# Altium footprint library 5.12-直插元件.PcbLib: 165 footprints (part 2 of 11)
Each footprint in its own frame and in the unit in brackets; x right, y up, seen from the top. Pads: shape width x height; smd on the part's side, far side on the other; paste and mask are expansions set on the pad; w line width, h text height; cw(c..) or ccw(c..) is an arc to the next point about the centre after c.
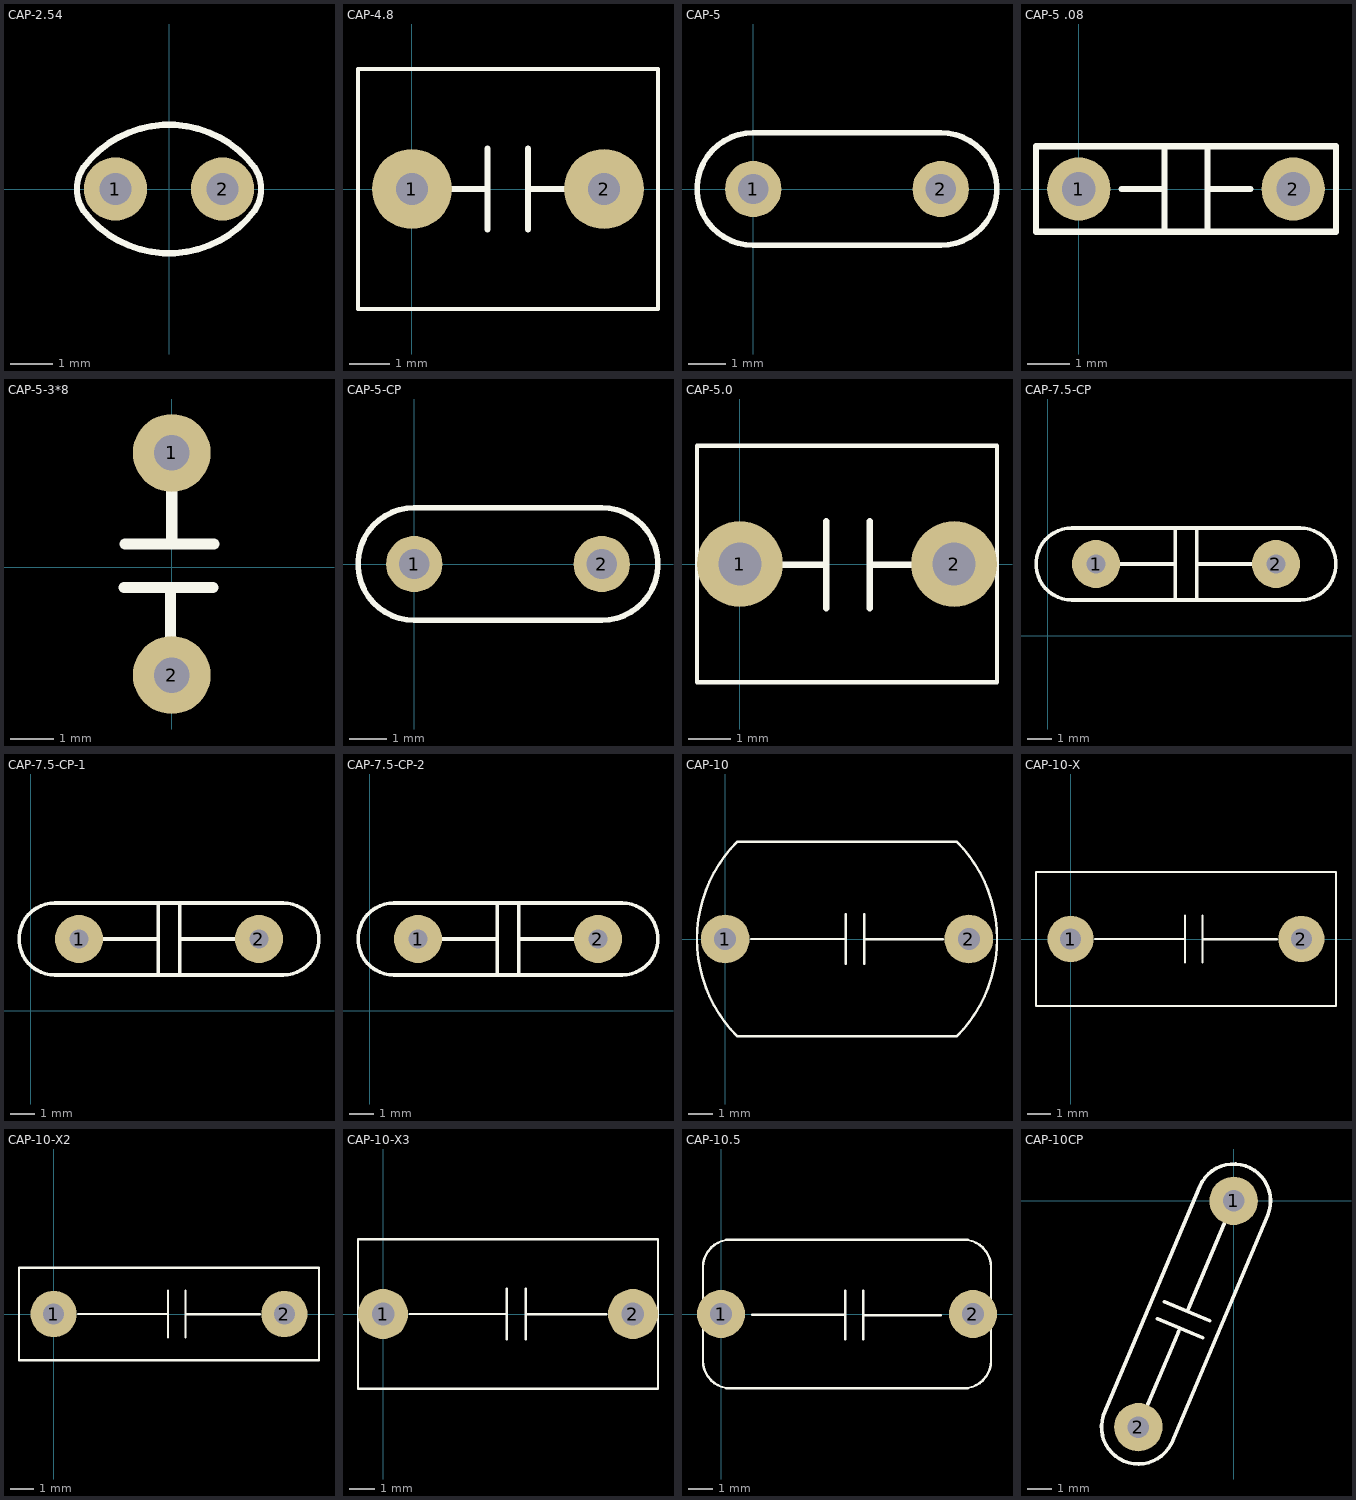
[diagram p1: the footprints below, top view; thin cyan lines are the x and y axes]

## CAP-2.54 [mm] "[ PCBѧϰȺ514746572 ]"
pads (2):
  round 1.5 hole 0.762: 1(-1.27,0) 2(1.27,0)
Top Overlay:
  lines w0.15: -2.032,-0.508 ccw(c0,1.016) 2.032,-0.508 ; -2.032,0.508 cw(c0,-1.016) 2.032,0.508 ; -2.031,-0.507 cw(c-1.27,0) -2.031,0.507 ; 2.031,-0.507 ccw(c1.27,0) 2.031,0.507
3D body "Cap_100n.step": height 5.92, standoff -2, extent -2.919,-0.848 2.919,0.848

## CAP-4.8 [mm] "[ PCBѧϰȺ514746572 ]"
pads (2):
  round 2 hole 0.8: 1(0,0) 2(4.8,0)
Top Overlay:
  lines w0.1: -1.35,-3 6.15,-3 6.15,3 -1.35,3 -1.35,-3
  lines w0.15: 0.869,0 1.885,0 ; 1.885,-1.016 1.885,1.016 ; 2.901,-1.016 2.901,1.016 ; 2.901,0 3.917,0
3D body "User Library-folienkondi - wima mks 2.step": height 11.5, standoff -3, extent -1.2,-2.7 6,2.7

## CAP-5 [mm] "[ PCBѧϰȺ514746572 ]"
pads (2):
  round 1.5 hole 0.8: 1(0,0) 2(5,0)
Top Overlay:
  lines w0.15: 0,-1.5 cw(c0,0) 0,1.5 5,1.5 cw(c5,0) 5,-1.5 0,-1.5
3D body "User Library-100n.step": height 7.6, standoff -4.6, extent -1.25,-1.25 6.25,1.25

## CAP-5 .08 [mm] "[ PCBѧϰȺ514746572 ]"
pads (2):
  round 1.5 hole 0.8: 1(0,0) 2(5.08,0)
Top Overlay:
  lines w0.15: 1.016,0 2.032,0 ; 2.032,-1.016 2.032,1.016 ; 3.048,-1.016 3.048,1.016 ; 3.048,0 4.064,0 ; -1.016,-1.016 6.096,-1.016 6.096,1.016 -1.016,1.016 -1.016,-1.016
3D body "SW3dPS-CAPNP5.STEP": height 6.51, standoff -1.26, extent -1.27,-1.27 6.35,1.27

## CAP-5-3*8 [mil] "[ PCBѧϰȺ514746572 ]"
pads (2):
  round 70 hole 32: 1(0,103) 2(0,-97)
Top Overlay:
  lines w10: -43,-18 37,-18 ; -42,21 38,21 ; -1,-96 -1,-18 ; 0,21 0,103
3D body "User Library-Capacitor no pol 0_2in pitch.STEP": height 285, standoff -93.74, extent -60,-104 65,116

## CAP-5-CP [mm] "[ PCBѧϰȺ514746572 ]"
pads (2):
  round 1.5 hole 0.8: 1(0,0) 2(5,0)
Top Overlay:
  lines w0.15: 0,-1.5 cw(c0,0) 0,1.5 5,1.5 cw(c5,0) 5,-1.5 0,-1.5
3D body "User Library-Kondensator_5mm.step": height 10.5, standoff -2.07, extent -1.5,-1.255 6.5,1.255

## CAP-5.0 [mm] "[ PCBѧϰȺ514746572 ]"
pads (2):
  round 2 hole 1: 1(0,0) 2(5,0)
Top Overlay:
  lines w0.1: 6,-2.76 -1,-2.76 -1,2.76 6,2.76 ; 6,-2.75 6,2.75
  lines w0.15: 1,-0.021 2.016,-0.021 ; 2.016,-1.037 2.016,0.995 ; 3.032,-1.037 3.032,0.995 ; 3.032,-0.021 4.048,-0.021
3D body "User Library-CAPACITOR_5mm.step": height 11, standoff -4, extent -1,-2.76 6,2.76

## CAP-7.5-CP [mm] "[ PCBѧϰȺ514746572 ]"
pads (2):
  round 2 hole 0.8: 1(2,3) 2(9.5,3)
Top Overlay:
  lines w0.15: 2,3 5.3,3 ; 5.3,1.5 5.3,4.5 ; 6.2,1.5 6.2,4.5 ; 6.2,3 9.5,3 ; 1,1.5 cw(c1,3) 1,4.5 10.5,4.5 cw(c10.5,3) 10.5,1.5 1,1.5
3D body "User Library-final MOV7,5.step": height 16.5, standoff -2, extent 0.049,1.587 11.451,4.413

## CAP-7.5-CP-1 [mm] "[ PCBѧϰȺ514746572 ]"
pads (2):
  round 2 hole 0.8: 1(2,3) 2(9.5,3)
Top Overlay:
  lines w0.15: 2,3 5.3,3 ; 5.3,1.5 5.3,4.5 ; 6.2,1.5 6.2,4.5 ; 6.2,3 9.5,3 ; 1,1.5 cw(c1,3) 1,4.5 10.5,4.5 cw(c10.5,3) 10.5,1.5 1,1.5
3D body "ECK-A3D102KBP.step": height 9.03, standoff -4.16, extent 1.749,1.804 9.75,4.196

## CAP-7.5-CP-2 [mm] "[ PCBѧϰȺ514746572 ]"
pads (2):
  round 2 hole 0.8: 1(2,3) 2(9.5,3)
Top Overlay:
  lines w0.15: 2,3 5.3,3 ; 5.3,1.5 5.3,4.5 ; 6.2,1.5 6.2,4.5 ; 6.2,3 9.5,3 ; 1,1.5 cw(c1,3) 1,4.5 10.5,4.5 cw(c10.5,3) 10.5,1.5 1,1.5
3D body "User Library-DEBB33A472KA3B.STEP": height 16, standoff -4, extent -0.25,1.01 11.75,4.99

## CAP-10 [mm] "[ PCBѧϰȺ514746572 ]"
pads (2):
  round 2 hole 0.9: 1(0,0) 2(10,0)
Top Overlay:
  lines w0.1: 1.072,0 4.953,0.003 ; 4.953,-1.016 4.953,1.016 ; 5.715,-1.016 5.715,1.016 ; 5.715,-0.007 8.939,-0.007 ; 0.5,-4 cw(c4.5,0) 0.5,4 9.5,4 cw(c5.5,0) 9.5,-4 0.5,-4
3D body "User Library-RAD CAP 12_5MM.STEP": height 15.97, standoff -4.44, extent -1.25,-2.95 11.25,2.95

## CAP-10-X [mm] "[ PCBѧϰȺ514746572 ]"
pads (2):
  round 2 hole 0.9: 1(0,0) 2(10,0)
Top Overlay:
  lines w0.1: 1.072,0 4.953,0.003 ; 4.953,-1.016 4.953,1.016 ; 5.715,-1.016 5.715,1.016 ; 5.715,-0.007 8.939,-0.007 ; -1.5,-2.9 11.5,-2.9 11.5,2.9 -1.5,2.9 -1.5,-2.9
3D body "User Library-B81122-C1472-M.step": height 12, standoff -1.5, extent -1.5,-3 11.5,3

## CAP-10-X2 [mm] "[ PCBѧϰȺ514746572 ]"
pads (2):
  round 2 hole 0.9: 1(0,0) 2(10,0)
Top Overlay:
  lines w0.1: 1.072,0 4.953,0.003 ; 4.953,-1.016 4.953,1.016 ; 5.715,-1.016 5.715,1.016 ; 5.715,-0.007 8.939,-0.007 ; -1.5,-2 11.5,-2 11.5,2 -1.5,2 -1.5,-2
3D body "User Library-MKS4(H9).step": height 9, standoff -1.5, extent -1.5,-2 11.5,2

## CAP-10-X3 [mm] "[ PCBѧϰȺ514746572 ]"
pads (2):
  round 2 hole 0.9: 1(0,0) 2(10,0)
Top Overlay:
  lines w0.1: 1.072,0 4.953,0.003 ; 4.953,-1.016 4.953,1.016 ; 5.715,-1.016 5.715,1.016 ; 5.715,-0.007 8.939,-0.007 ; -1,-3 -1,3 11,3 11,-3 -1,-3
3D body "User Library-K73-17(12_6_10).step": height 11.5, standoff -1.5, extent -1,-3 11,3

## CAP-10.5 [mm] "[ PCBѧϰȺ514746572 ]"
pads (2):
  round 2 hole 0.9: 1(0,0) 2(10.5,0)
Top Overlay:
  lines w0.1: 0.403,-3.1 cw(c0.403,-1.947) -0.75,-1.947 -0.75,1.947 cw(c0.403,1.947) 0.403,3.1 10.097,3.1 cw(c10.097,1.947) 11.25,1.947 11.25,-1.947 cw(c10.097,-1.947) 10.097,-3.1 0.423,-3.1 ; 1.291,-0.037 5.172,-0.034 ; 5.172,-1.053 5.172,0.979 ; 5.934,-1.053 5.934,0.979 ; 5.934,-0.044 9.158,-0.044
3D body "电?": height 14.65, standoff -3.65, extent -0.75,-3.1 11.25,3.1

## CAP-10CP [mm] "[ PCBѧϰȺ514746572 ]"
pads (2):
  round 2 hole 0.9: 1(0,0) 2(-3.942,-9.364)
Top Overlay:
  lines w0.15: -5.394,-8.885 -1.405,0.591 cw(c0,0) 1.405,-0.591 -2.585,-10.067 ; -5.391,-8.891 ccw(c-3.942,-9.364) -2.591,-10.07 ; -3.548,-8.428 -2.316,-5.501 -2.267,-5.384 ; -3.154,-4.873 -1.281,-5.661 ; -2.858,-4.171 -0.985,-4.959 ; -1.922,-4.565 -1.823,-4.331 -0.394,-0.936
3D body "User Library-440LD68.STEP": height 23.43, standoff -3, extent -4.995,-13.888 1.005,4.412